# Altium footprint library tianxiaohua_PcbLib.PcbLib: 138 footprints (part 1 of 9)
Each footprint in its own frame and in the unit in brackets; x right, y up, seen from the top. Pads: shape width x height; smd on the part's side, far side on the other; paste and mask are expansions set on the pad; w line width, h text height; cw(c..) or ccw(c..) is an arc to the next point about the centre after c.
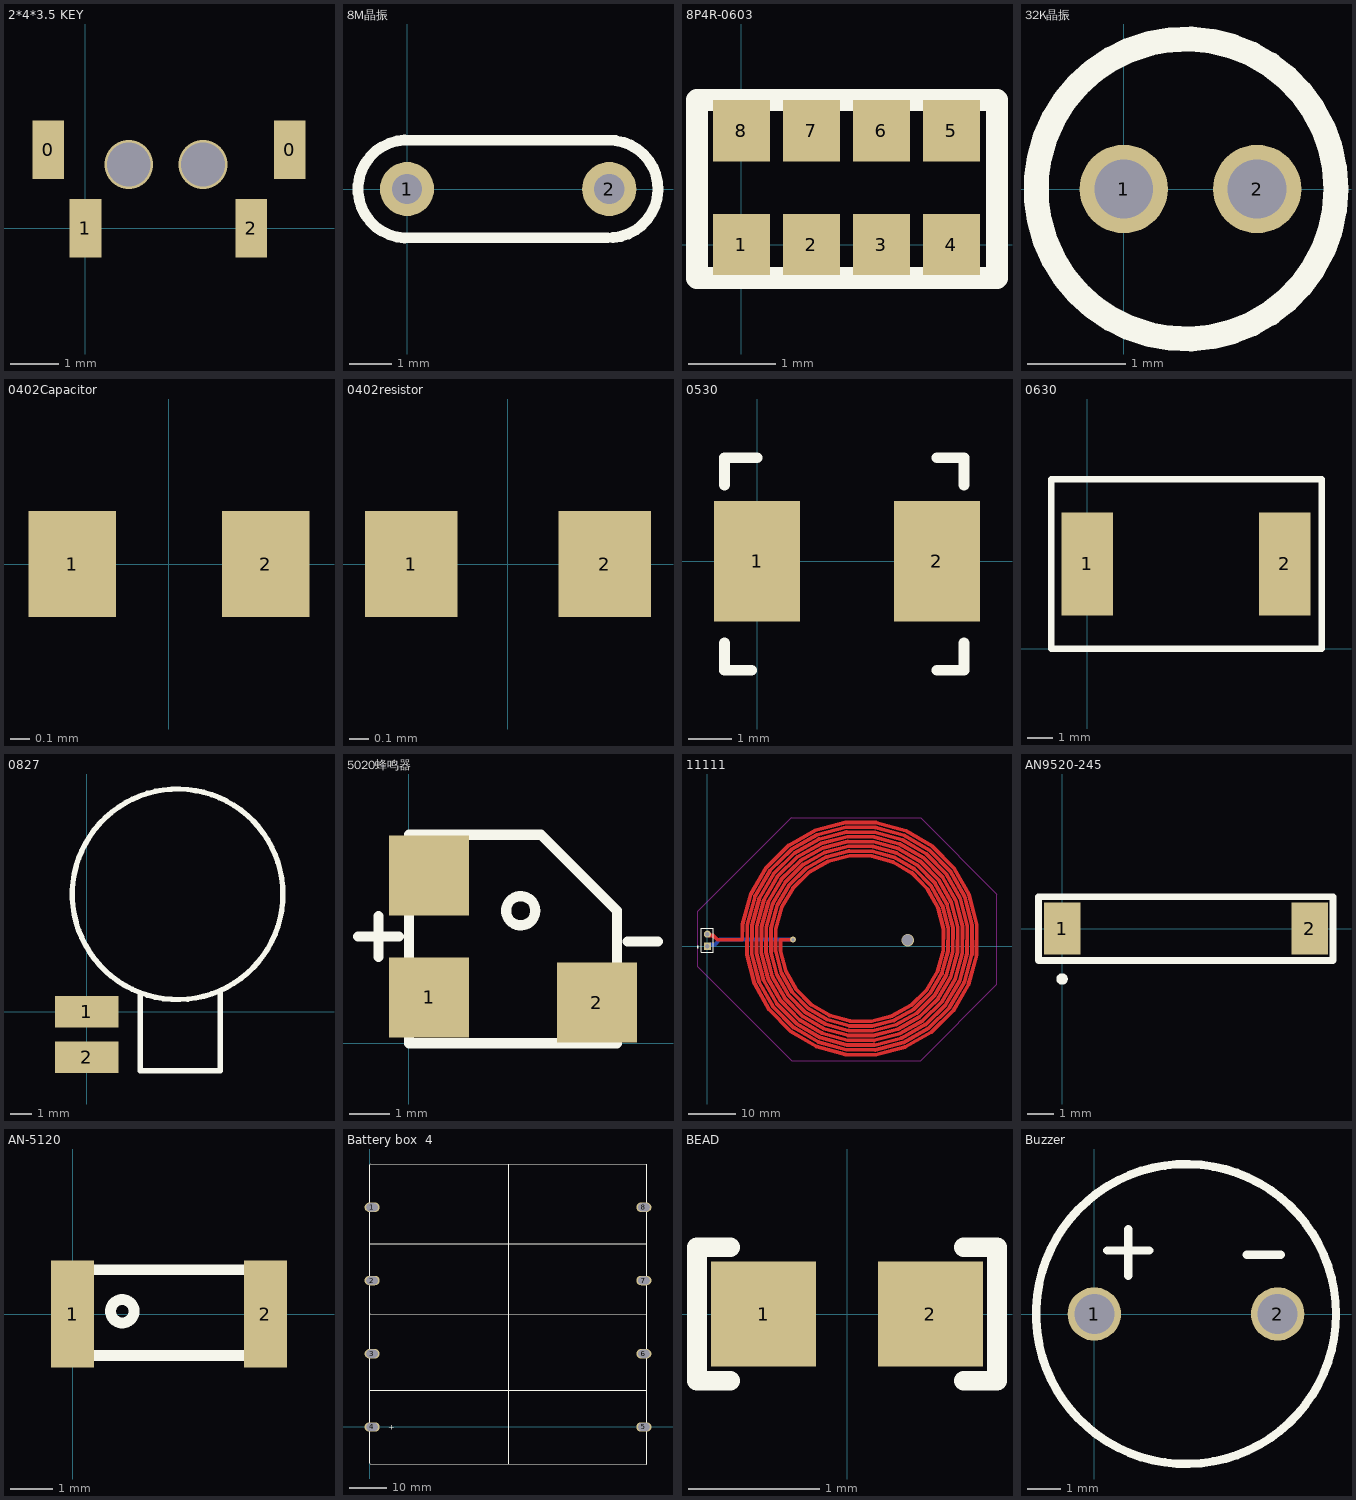
[diagram p0: the footprints below, top view; thin cyan lines are the x and y axes]

## 2*4*3.5 KEY [mm] "非常小的贴片卧式按键"
pads (4):
  rect 0.65x1.2 smd: 0(-0.762,1.6) 0(4.191,1.6) 1(0,0) 2(3.4,0)
via 2.413,1.3 diameter 1 hole 0.9
via 0.889,1.3 diameter 1 hole 0.9
3D body: height 1, standoff 0.4, extent 0.635,2.159 2.794,3.302
3D body: height 1.9, standoff 0, extent -0.508,-0.508 3.937,2.159

## 8M晶振 [mm]
pads (2):
  round 1.27 hole 0.71: 1(0,0) 2(4.74,0)
Top Overlay:
  lines w0.254: 4.699,-1.143 0.127,-1.143 cw(c0,0) 0.127,1.143 4.699,1.143 cw(c4.74,0) 4.826,-1.141

## 8P4R-0603 [mm]
pads (8):
  rect 0.65x0.7 smd: 1(0,0) 2(0.8,0) 3(1.6,0) 4(2.4,0) 5(2.4,1.3) 6(1.6,1.3) 7(0.8,1.3) 8(0,1.3)
Top Overlay:
  lines w0.254: -0.508,-0.381 -0.508,1.651 2.921,1.651 2.921,-0.381 -0.508,-0.381
3D body: height 0.5, standoff 0, extent -0.254,-0.064 0.254,0.317
3D body: height 0.5, standoff 0, extent 0.508,-0.064 1.016,0.317
3D body: height 0.5, standoff 0, extent 1.397,-0.064 1.905,0.318
3D body: height 0.5, standoff 0, extent 2.159,-0.064 2.667,0.318
3D body: height 0.5, standoff 0, extent 2.159,1.016 2.667,1.397
3D body: height 0.5, standoff 0, extent 1.397,1.016 1.905,1.397
3D body: height 0.5, standoff 0, extent 0.508,1.016 1.016,1.397
3D body: height 0.5, standoff 0, extent -0.254,1.016 0.254,1.397
3D body: height 0.5, standoff 0, extent -0.254,0.254 2.667,1.016

## 32K晶振 [mm]
pads (2):
  round 0.9 hole 0.6: 1(0,0) 2(1.36,0)
Top Overlay:
  circle w0.254: c0.635,0 r1.529
3D body: height 3, standoff 0, extent -0.894,-1.528 2.164,1.529

## 0402Capacitor [mm]
pads (2):
  rect 0.45x0.55 smd: 1(-0.5,0) 2(0.5,0)
3D body "CC0402.STEP": height 0.3, standoff 0, extent -0.5,-0.25 0.5,0.25

## 0402resistor [mm]
pads (2):
  rect 0.48x0.55 smd: 1(-0.5,0) 2(0.5,0)
3D body "R0402.STEP": height 0.35, standoff 0, extent -0.5,-0.25 0.5,0.25

## 0530 [mm] "电感"
pads (2):
  rect 2x2.8 smd: 1(0,0) 2(4.191,0)
Top Overlay:
  lines w0.254: -0.762,-1.905 -0.762,-2.54 -0.127,-2.54 ; -0.762,1.778 -0.762,2.413 0,2.413 ; 4.191,-2.54 4.826,-2.54 4.826,-1.905 ; 4.191,2.413 4.826,2.413 4.826,1.778
3D body "User Library-FERROCORE HPI0530-100.step": height 3.1, standoff 0, extent -0.768,-2.54 4.832,2.46

## 0630 [mm]
pads (2):
  rect 2x4 smd: 1(0,3.3) 2(7.7,3.3)
Top Overlay:
  lines w0.254: -1.397,0 -1.397,6.6 9.144,6.6 9.144,0 -1.397,0
3D body: height 2.8, standoff 0, extent 0,0 7.62,6.604

## 0827 [mm] "震动马达高度2.7，直径8mm"
height 2.7
pads (2):
  rect 3x1.5 smd: 1(0,0) 2(0,-2.159)
Top Overlay:
  circle w0.254: c4.318,5.588 r5
  lines w0.254: 2.54,-2.794 2.54,0.889 ; 2.667,-2.794 6.35,-2.794 ; 6.35,-2.667 6.35,1.016
3D body: height 2.7, standoff 0, extent -0.555,0.588 9.445,10.588
3D body: height 1, standoff 0, extent 2.54,-2.921 6.223,0.889

## 5020蜂鸣器 [mm] "蜂鸣器 贴片封装"
height 2
pads (3):
  rect 2x2 smd: 1(0.508,1.143) 2(4.699,1.016) ""(0.508,4.191)
Top Overlay:
  circle w0.254: c2.794,3.309 r0.364
  lines w0.254: -1.27,2.667 -0.254,2.667 ; -0.762,2.159 -0.762,3.175 ; 5.461,2.54 6.223,2.54 ; 0,0 5.2,0 5.2,3.309 3.302,5.207 0,5.207 0,0
3D body: height 2.01, standoff 0, extent 2.306,2.794 3.302,3.792
3D body: height 2, standoff 0, extent 0,0 5.207,5.08

## 11111 [mm]
pads (2):
  rect 1.5x1.5 hole 0.9: 1(0,0)
  round 1.5 hole 0.9: 2(0,2.54)
via 17.964,1.4 diameter 1.27 hole 0.711
via 42,1.27 diameter 2.6 hole 2.3
Top Layer:
  lines w0.8: 0.286,2.289 1.175,2.289 2.094,1.37 6.372,1.37 7.313,1.368 7.354,4.634 9.084,10.927 12.377,16.549 17.006,21.118 22.65,24.329 28.922,25.966 35.393,25.925 41.623,24.212 47.187,20.952 51.71,16.369 54.888,10.782 56.508,4.574 56.467,-1.832 54.772,-7.997 51.544,-13.505 47.008,-17.981 41.478,-21.126 35.333,-22.73 28.994,-22.688 22.891,-21.01 17.441,-17.815 13.011,-13.326 9.899,-7.853 8.313,-1.771 8.354,4.502 10.016,10.541 13.178,15.935 17.62,20.318 23.036,23.397 29.054,24.966 35.262,24.925 41.237,23.28 46.573,20.151 50.91,15.755 53.956,10.396 55.508,4.442 55.467,-1.7 53.84,-7.611 50.744,-12.891 46.394,-17.181 41.092,-20.194 35.201,-21.73 29.125,-21.688 23.277,-20.078 18.055,-17.015 13.811,-12.712 10.831,-7.467 9.313,-1.64 9.354,4.371 10.947,10.155 13.978,15.321 18.234,19.518 23.422,22.465 29.186,23.966 35.13,23.925 40.851,22.349 45.959,19.351 50.11,15.141 53.024,10.01 54.508,4.31 54.467,-1.568 52.908,-7.225 49.943,-12.277 45.78,-16.381 40.706,-19.262 35.07,-20.73 29.257,-20.688 23.663,-19.146 18.669,-16.214 14.611,-12.098 11.763,-7.081 10.313,-1.508 10.354,4.239 11.879,9.769 14.778,14.707 18.848,18.718 23.808,21.533 29.317,22.966 34.999,22.925 40.465,21.417 45.345,18.551 49.31,14.527 52.092,9.624 53.508,4.179 53.467,-1.437 51.976,-6.839 49.143,-11.663 45.166,-15.581 40.32,-18.331 34.938,-19.73 29.388,-19.688 24.049,-18.214 19.283,-15.414 15.411,-11.484 12.695,-6.695 11.313,-1.376 11.354,4.108 12.811,9.383 15.578,14.092 19.462,17.917 24.194,20.601 29.449,21.966 34.867,21.925 40.079,20.485 44.731,17.751 48.51,13.913 51.161,9.238 52.508,4.047 52.467,-1.305 51.044,-6.453 48.343,-11.049 44.552,-14.781 39.934,-17.399 34.807,-18.73 29.52,-18.688 24.435,-17.282 19.897,-14.614 16.212,-10.87 13.626,-6.309 12.313,-1.245 12.354,3.976 13.743,8.997 16.378,13.478 20.076,17.117 24.58,19.669 29.58,20.966 34.735,20.925 39.693,19.553 44.117,16.951 47.709,13.299 50.229,8.852 51.508,3.916 51.467,-1.173 50.112,-6.067 47.543,-10.435 43.938,-13.98 39.548,-16.467 34.675,-17.73 29.652,-17.688 24.821,-16.35 20.511,-13.814 17.012,-10.256 14.558,-5.923 13.313,-1.113 13.354,3.844 14.675,8.611 17.179,12.864 20.69,16.317 24.966,18.738 29.712,19.966 34.604,19.925 39.307,18.621 43.503,16.15 46.909,12.685 49.297,8.466 50.508,3.784 50.467,-1.042 49.18,-5.682 46.743,-9.821 43.324,-13.18 39.162,-15.535 34.543,-16.73 29.783,-16.688 25.207,-15.419 21.125,-13.014 17.812,-9.642 15.49,-5.537 14.313,-0.981 14.354,3.713 15.607,8.225 17.979,12.25 21.304,15.517 25.352,17.806 29.844,18.966 34.472,18.925 38.921,17.689 42.889,15.35 46.109,12.071 48.365,8.08 49.508,3.652 49.467,-0.91 48.249,-5.296 45.942,-9.207 42.71,-12.38 38.776,-14.603 34.412,-15.73 29.915,-15.688 25.593,-14.487 21.739,-12.213 18.612,-9.028 16.422,-5.151 15.313,-0.85 15.354,1.368 17.933,1.368 17.964,1.4
Bottom Layer:
  lines w0.8: 0.032,-0.251 0.667,0.384 1.581,0.384 2.597,1.4 17.964,1.4
Top Overlay:
  circle w0.254: c-2.032,-0.141 r0.141
  lines w0.2: -1.27,-1.27 1.27,-1.27 1.27,3.81 -1.27,3.81 -1.27,-1.27
Keep-Out Layer:
  lines w0.254: 17.685,27 44.736,27 ; 17.685,27.054 -2,7.369 -2,-4.315 17.685,-24 ; 24.797,-24 17.685,-24 ; 43.212,-24 44.736,-24 ; 44.736,26.927 60.738,10.925 60.738,-7.998 44.736,-24 ; 17.685,-24 44.736,-24
3D body "1001-2.STEP": height 8.54, standoff -3, extent -1.27,-1.27 1.27,3.81

## AN9520-245 [mm]
pads (2):
  rect 1.4x2 smd: 1(0,0) 2(9.5,0)
Top Overlay:
  circle w0.254: c0,-1.935 r0.091
  lines w0.254: -0.903,-1.225 -0.903,1.225 10.385,1.225 10.385,-1.225 -0.903,-1.225
3D body: height 1.01, standoff 0.1, extent 1.507,-0.276 2.105,0.323
3D body: height 1, standoff 0, extent 8.127,-1.032 9.675,1.032
3D body: height 1, standoff 0, extent -0.194,-1.032 1.354,1.032
3D body: height 1, standoff 0, extent 1.354,-1.032 8.127,1.032

## AN-5120 [mm]
pads (2):
  rect 1x2.5 smd: 1(0,0) 2(4.5,0)
Top Overlay:
  circle w0.254: c1.161,0.065 r0.274
  lines w0.254: -0.323,-0.968 -0.323,1.032 4.777,1.032 4.777,-0.968 -0.323,-0.968
3D body: height 1.2, standoff 0, extent 0.764,-0.399 1.561,0.399
3D body: height 1.2, standoff 0, extent 0.516,-1.032 3.999,1.032
3D body: height 1.2, standoff 0, extent -0.323,-1.032 0.516,1.032
3D body: height 1.2, standoff 0, extent 3.999,-1.032 4.773,1.032

## Battery box  4 [mm] "可以容纳4节18650电池"
pads (8):
  oval 4x2.5 hole 2 slot 3 at 0 deg: 1(0.635,57.9) 2(0.635,38.6) 3(0.635,19.3) 5(72.263,0) 6(72.263,19.3) 7(72.263,38.6) 8(72.263,57.9)
  oval 4x2.5 hole 2 slot 3 at 0 deg paste+0: 4(0.635,0)
Top Overlay:
  lines w0.254: 0,-9.544 0,0 ; 0,57.773 0,-0.127 0.635,0.127 ; 0,57.9 0,69.165 ; 0.133,-9.677 73.033,-9.751 ; 0.133,29.82 73.033,29.746 ; 0.14,9.65 73.04,9.65 ; 0.14,48.25 73.04,48.25 ; 0.14,69.305 73.04,69.231 ; 36.583,-9.637 36.583,69.203 ; 73,-9.718 73,0 73,57.9 73,69.191
  text "+" at 4.953,-0.762 h1.52
3D body "User Library-18650 battery.step": height 20.23, standoff 2.03, extent 3.874,-9.437 69.024,8.763
3D body "User Library-18650 battery.step": height 20.23, standoff 2.03, extent 3.874,10.121 69.024,28.321
3D body "User Library-18650 battery.step": height 20.23, standoff 2.03, extent 3.747,29.425 68.897,47.625
3D body "User Library-18650 battery.step": height 20.23, standoff 2.03, extent 3.747,49.022 68.897,67.222
3D body "User Library-18650 Full.STEP": height 21.65, standoff -3.83, extent -2.212,-10.267 75.438,68.433

## BEAD [mm] "0R电感"
pads (2):
  rect 0.8x0.8 smd: 1(-0.635,0) 2(0.635,0)
Top Overlay:
  lines w0.15: -0.889,-0.508 -1.143,-0.508 -1.143,0.254 -1.143,0.508 -0.889,0.508 ; 0.889,-0.508 1.143,-0.508 1.143,0.254 1.143,0.508 0.889,0.508
3D body "CircuitWorks-RESISTOR 0603.step": height 0.48, standoff -0.03, extent -0.8,-0.43 0.8,0.43

## Buzzer [mm] "蜂鸣器 型号0905 直径9毫米，高度5.5毫米"
pads (2):
  round 1.6 hole 1.2: 1(0,0) 2(5.5,0)
Top Overlay:
  circle w0.254: c2.75,0 r4.5
  lines w0.254: 0.381,1.905 1.651,1.905 ; 1.016,1.143 1.016,2.54 ; 4.572,1.778 5.588,1.778
3D body "BUZZER-0905.step": height 5.5, standoff -5, extent -1.933,-4.6 7.287,4.6